# Altium footprint library 常用元件封装库.PcbLib: 1310 footprints (part 38 of 83)
Each footprint in its own frame and in the unit in brackets; x right, y up, seen from the top. Pads: shape width x height; smd on the part's side, far side on the other; paste and mask are expansions set on the pad; w line width, h text height; cw(c..) or ccw(c..) is an arc to the next point about the centre after c.
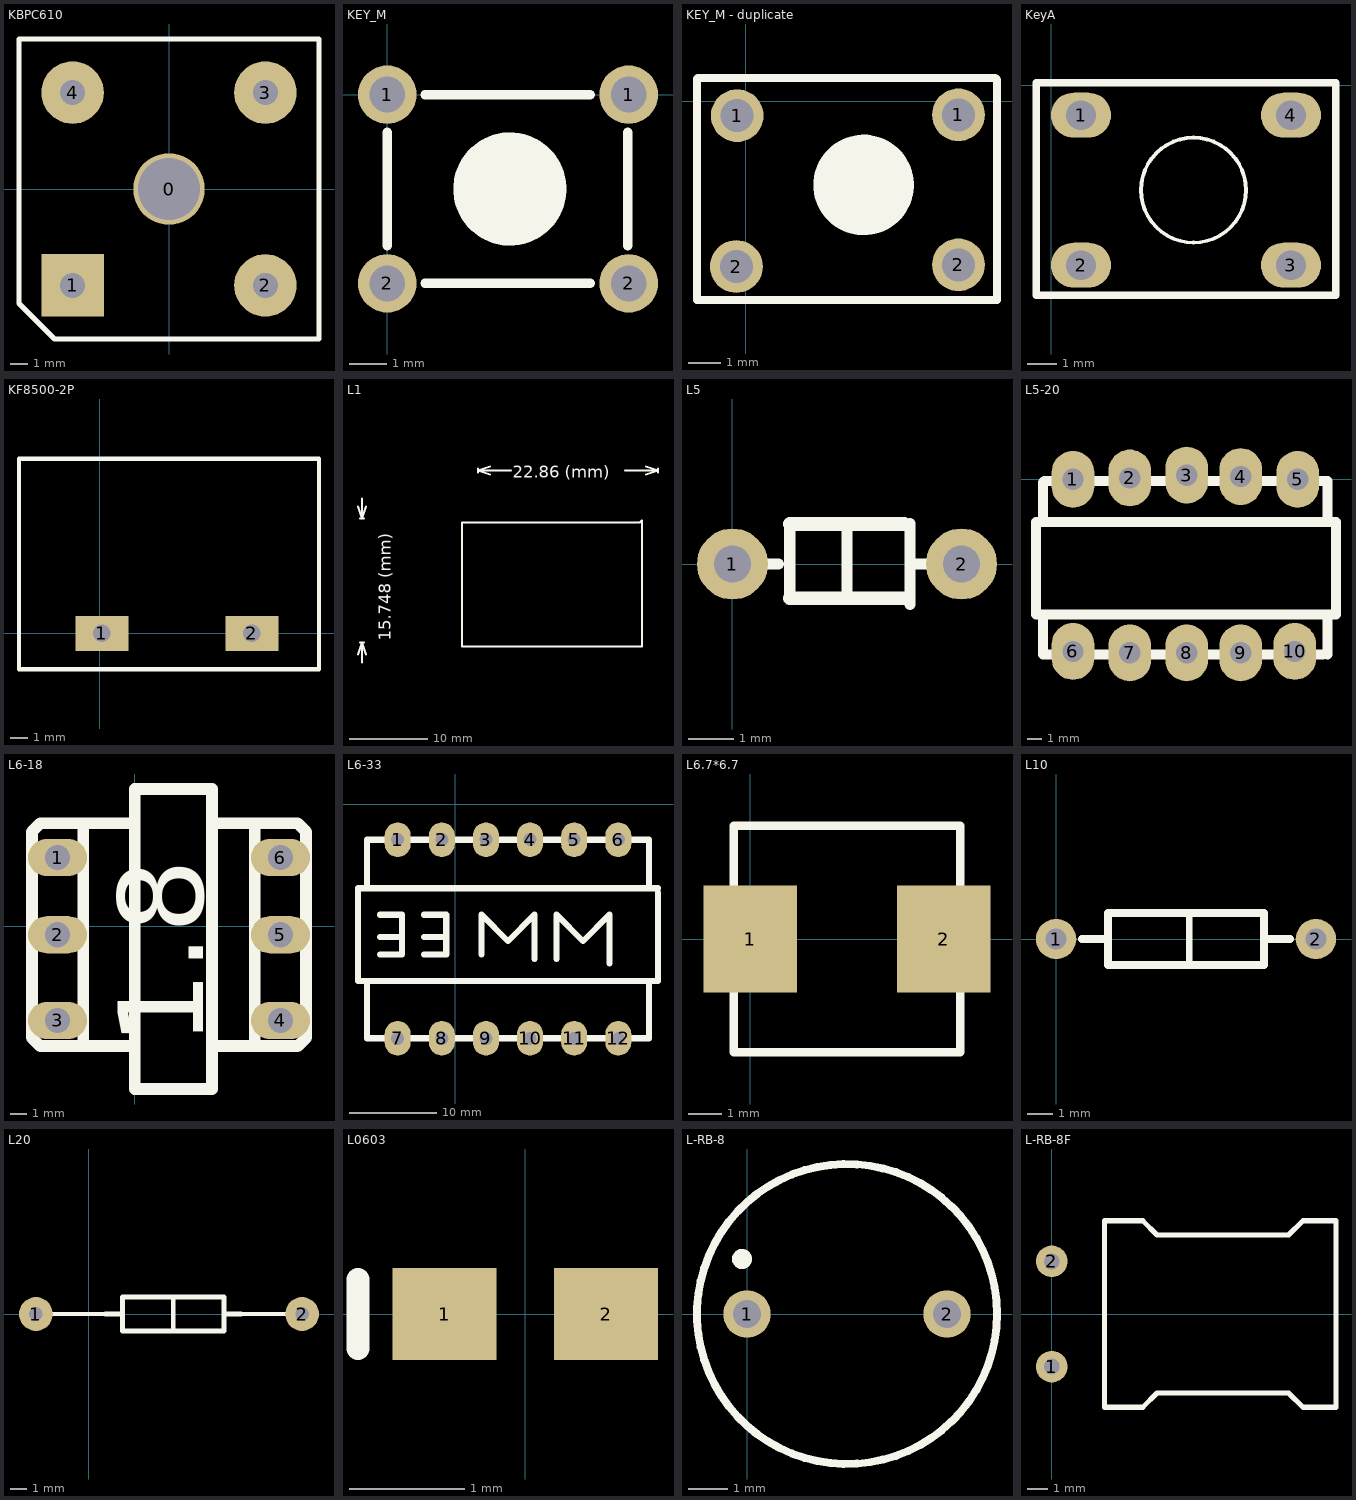
[diagram p37: the footprints below, top view; thin cyan lines are the x and y axes]

## KBPC610 [mm]
pads (5):
  round 4 hole 3.5: 0(0,0)
  rect 3.5x3.5 hole 1.4: 1(-5.4,-5.4)
  round 3.5 hole 1.4: 2(5.4,-5.4) 3(5.4,5.4) 4(-5.4,5.4)
Top Overlay:
  lines w0.305: -8.4,-6.4 -6.4,-8.4 8.4,-8.4 8.4,8.4 -8.4,8.4 -8.4,-6.4

## KEY_M [mil]
pads (4):
  round 62 hole 38: 1(0,0) 1(255.91,0) 2(0,-200) 2(255.91,-200)
Top Overlay:
  circle w60: c130,-100 r30
  lines w10: -0.03,-160 -0.03,-40 ; 39.97,-200 215,-200 ; 39.97,0 215,0 ; 255,-160 255,-40
3D body "User Library-Tactile switch 6x6x5mm.STEP": height 197.24, standoff -138.19, extent -25.84,-216.7 279,20.7

## KEY_M - duplicate [mm]
pads (4):
  round 1.6 hole 1: 1(-0.254,-0.432) 1(6.452,-0.406) 2(-0.279,-5.004) 2(6.452,-4.953)
Top Overlay:
  circle w1.524: c3.578,-2.533 r0.762
  lines w0.254: -1.473,-6.02 -1.473,0.457 -1.473,0.686 -1.448,0.711 6.553,0.711 7.569,0.711 7.62,0.66 7.62,-6.02 -1.473,-6.02
3D body "User Library-Tactile switch 6x6x5mm.STEP": height 5.01, standoff -3.51, extent -0.758,-5.758 6.985,0.272

## KeyA [mil]
pads (4):
  oval 80x60 hole 39.37: 1(40,-40) 2(40,-240) 3(320,-240) 4(320,-40)
Top Overlay:
  circle w5: c190,-140 r70
  lines w10: -20,-280 140,-280 380,-280 380,-240 380,2.99 371.02,2.99 8.82,2.99 -20,2.99 -20,0 -20,-240 -20,-280

## KF8500-2P [mm]
pads (2):
  rect 3x2 hole 1 square: 1(0.127,0) 2(8.636,0)
Top Overlay:
  lines w0.254: -4.572,-2.032 -4.572,9.906 12.446,9.906 12.446,-2.032 -4.572,-2.032
3D body "User Library-KF8500-2P.STEP": height 12.4, standoff -3.85, extent -4.055,-2.083 12.945,9.917

## L1 [mil]
Top Overlay:
  lines w10: 6480,42340 6500,42400 ; 6480,43080 6500,43020 ; 6490,42400 6510,42400 ; 6490,43020 6510,43020 ; 6500,42300 6500,42400 ; 6500,43120 6500,43020 ; 6520,42340 6500,42400 ; 6520,43080 6500,43020 ; 7080,43250 7080,43270 ; 7140,43240 7080,43260 ; 7140,43280 7080,43260 ; 7244.09,43260 7080,43260 ; 7815.91,43260 7980,43260 ; 7920,43240 7980,43260 ; 7920,43280 7980,43260 ; 7980,43250 7980,43270 ; 7000,42380 7000,43000 7890,43000 7900,43010 7900,42380 7000,42380
  text "15.748 (mm)" at 6643.96,42409.1 h60
  text "22.86 (mm)" at 7254.09,43224.01 h60

## L5 [mil]
pads (2):
  round 62 hole 32: 1(0,0) 2(200,0)
Top Overlay:
  lines w10: 0,0 40,0 ; 50,-30 50,35 ; 100,-30 100,35 ; 155,-35 155,35 ; 155,0 200,0
  lines w12: 50,-30 150,-30 ; 50,35 150,35

## L5-20 [mm]
pads (10):
  oval 3x4 hole 1.5: 1(-23.2,0) 2(-19.2,0.1) 3(-15.2,0.3) 4(-11.4,0.2) 5(-7.4,0) 6(-23.2,-12.1) 7(-19.2,-12.2) 8(-15.2,-12.2) 9(-11.4,-12.2) 10(-7.6,-12.1)
Top Overlay:
  lines w0.7: -25.3,-9.5 -25.3,-12.3 -5.6,-12.3 ; -25.3,-3 -25.3,-0.2 -25.2,-0.1 -5.3,-0.1 -5.3,-3 ; -5.3,-12.3 -5.3,-9.5 ; -25.8,-9.5 -25.8,-3 ; -25.8,-9.5 -4.7,-9.5 ; -25.8,-9.5 -25.8,-3 ; -25.8,-3 -4.7,-3 ; -4.7,-9.5 -4.7,-3 ; -4.7,-9.5 -4.7,-3

## L6-18 [mm]
pads (6):
  oval 3.5x2.2 hole 1.5: 1(-4.572,4.064) 2(-4.572,-0.508) 3(-4.572,-5.588) 4(8.636,-5.588) 5(8.636,-0.508) 6(8.636,4.064)
Top Overlay:
  lines w0.7: -5.08,-7.112 0,-7.112 ; -4.572,-7.112 -5.588,-7.112 -6.096,-6.604 -6.096,5.588 -5.588,6.096 0,6.096 ; -3.048,-7.112 -3.048,6.096 ; 4.572,-7.112 9.144,-7.112 9.652,-7.112 10.16,-6.604 10.16,5.588 9.652,6.096 9.144,6.096 4.572,6.096 ; 7.112,-7.112 7.112,6.096 ; 0,-9.652 0,8.128 4.572,8.128 4.572,-9.652 0,-9.652
  text "1.8" at 4.064,-7.112 h5.08

## L6-33 [mm]
pads (12):
  oval 3x4 hole 1.5: 1(-6.604,-4.064) 2(-1.524,-4.064) 3(3.556,-4.064) 4(8.636,-4.064) 5(13.716,-4.064) 6(18.796,-4.064) 7(-6.604,-26.924) 8(-1.524,-26.924) 9(3.556,-26.924) 10(8.636,-26.924) 11(13.716,-26.924) 12(18.796,-26.924)
Top Overlay:
  lines w0.7: -10.16,-20.32 -10.16,-26.924 22.352,-26.924 22.352,-20.32 ; -10.16,-9.652 -10.16,-4.064 22.352,-4.064 ; -8.636,-17.272 -8.128,-17.272 -6.096,-17.272 -6.096,-15.24 ; -8.636,-15.24 -6.096,-15.24 ; -8.636,-12.7 -6.096,-12.7 -6.096,-15.24 ; -3.556,-17.272 -1.016,-17.272 -1.016,-12.7 -3.556,-12.7 ; -3.556,-15.24 -1.016,-15.24 ; 3.048,-17.272 3.048,-12.7 6.096,-15.748 9.144,-12.7 9.144,-17.78 ; 11.684,-17.78 11.684,-12.7 14.732,-15.748 17.78,-12.7 17.78,-18.288 ; 23.368,-10.16 23.368,-20.32 -11.176,-20.32 -11.176,-9.652 23.368,-9.652 ; 22.352,-4.064 22.352,-9.652 22.352,-4.064

## L6.7*6.7 [mm]
pads (2):
  rect 2.8x3.2 smd: 1(0,0) 2(5.8,0)
Top Overlay:
  lines w0.254: -0.5,-3.4 -0.5,3.4 2.9,3.4 6.3,3.4 6.3,-3.4 -0.5,-3.4
3D body "User Library-LQH32CN.STEP": height 2, standoff 0, extent 1.346,-1.405 4.548,1.304

## L10 [mil]
pads (2):
  round 62 hole 32: 1(0,0) 2(400,0)
Top Overlay:
  lines w10: 205,-40 205,40
  lines w12: 40,0 80,0 ; 320,0 360,0 ; 80,-40 80,40 320,40 320,-40 80,-40

## L20 [mil]
pads (2):
  round 80 hole 32: 1(-125,0) 2(505,0)
Top Overlay:
  lines w10: -125,0 35,0 ; 200,-40 200,40 ; 360,0 505,0
  lines w12: 40,0 80,0 ; 320,0 360,0 ; 80,-40 320,-40 320,40 80,40 80,-40

## L0603 [mm] "Chip Inductor; Body 1.6 x 0.8 mm (LxW typ)"
height 0.55
pads (2):
  rect 0.9x0.8 smd: 1(-0.7,0) 2(0.7,0)
Top Overlay:
  lines w0.2: -1.45,-0.3 -1.45,0.3

## L-RB-8 [mm] "Inductor"
pads (2):
  round 1.2 hole 0.7: 1(0,0) 2(5.08,0)
Top Overlay:
  circle w0.2: c2.54,0 r3.81
  circle w0.254: c-0.127,1.397 r0.127

## L-RB-8F [mil] "ֱ?"
height 472.44
pads (2):
  round 60 hole 30: 1(0,-100) 2(0,100)
Top Overlay:
  lines w10: 100,-177.17 100,177.17 172.83,177.17 200,150 450,150 477.17,177.17 540,177.17 540,-177.17 477.17,-177.17 450,-150 200,-150 172.83,-177.17 100,-177.17